# Altium footprint library Standard.PcbLib: 148 footprints (part 8 of 10)
Each footprint in its own frame and in the unit in brackets; x right, y up, seen from the top. Pads: shape width x height; smd on the part's side, far side on the other; paste and mask are expansions set on the pad; w line width, h text height; cw(c..) or ccw(c..) is an arc to the next point about the centre after c.
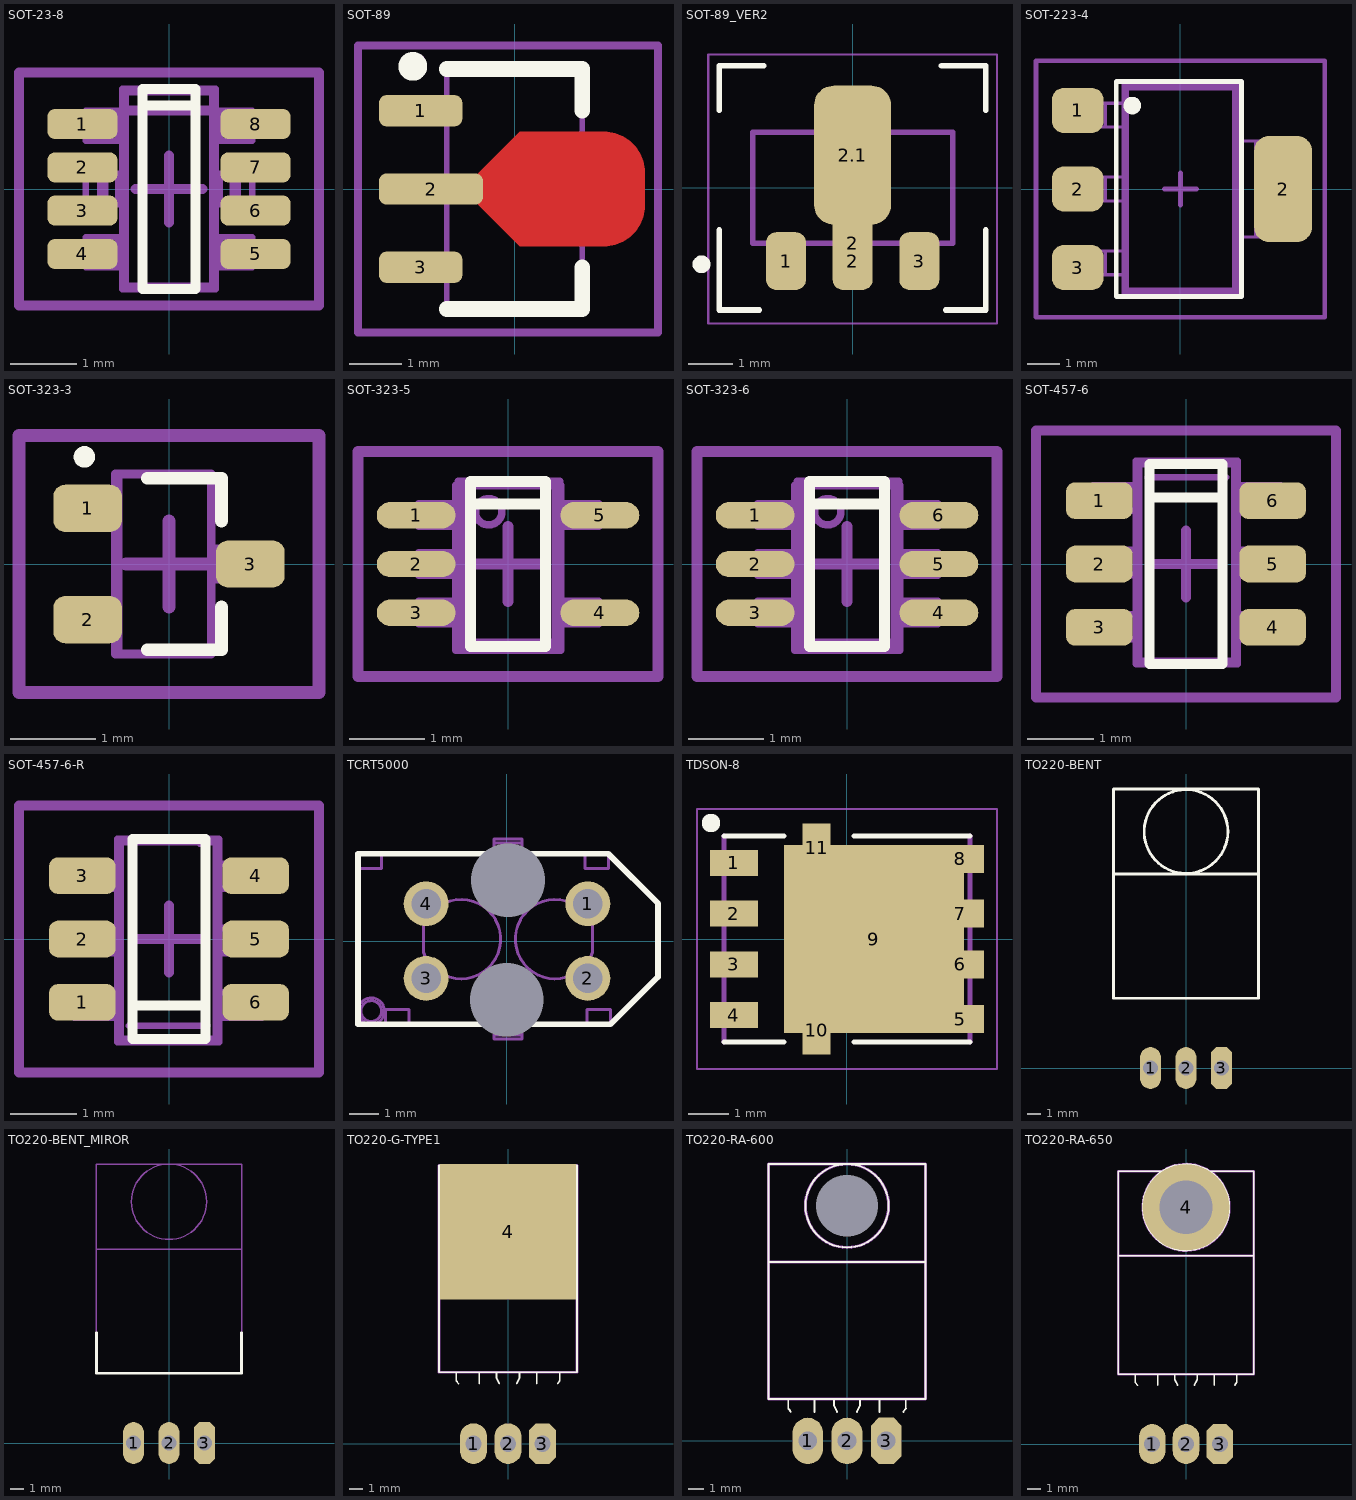
[diagram p7: the footprints below, top view; thin cyan lines are the x and y axes]

## SOT-23-8 [mm] "SOT23, 8-Leads, Body 2,90x2,30mm, Pitch 0,95mm, IPC Medium Density"
height 1.1
pads (8):
  rrect50% 1.05x0.45 smd: 1(-1.3,0.975) 2(-1.3,0.325) 3(-1.3,-0.325) 4(-1.3,-0.975) 5(1.3,-0.975) 6(1.3,-0.325) 7(1.3,0.325) 8(1.3,0.975)
Top Overlay:
  lines w0.15: -0.4,1.25 -0.4,-1.5 0.4,-1.5 0.4,1.25 ; -0.4,1.25 0.4,1.25 ; -0.4,1.25 -0.4,1.5 0.4,1.5 0.4,1.25
Top Assembly:
  lines w0.1: -1.25,-1.175 -0.7,-1.175 ; -1.25,-1.175 -1.25,-0.725 ; -1.25,-1.175 -1.25,-0.725 ; -1.25,-1.175 -1.027,-1.175 ; -1.25,-0.725 -0.7,-0.725 ; -1.25,-0.725 -1.027,-0.725 ; -1.25,-0.225 -1.25,0.225 ; -1.25,-0.225 -0.7,-0.225 ; -1.25,-0.225 -1.25,0.225 ; -1.25,-0.225 -1.027,-0.225 ; -1.25,0.225 -0.7,0.225 ; -1.25,0.225 -1.027,0.225 ; -1.25,0.725 -1.25,1.175 ; -1.25,0.725 -0.7,0.725 ; -1.25,0.725 -1.25,1.175 ; -1.25,0.725 -1.027,0.725 ; -1.25,1.175 -0.7,1.175 ; -1.25,1.175 -1.027,1.175 ; -1.027,-1.175 -0.977,-1.175 ; -1.027,-1.175 -1.027,-0.725 ; -1.027,-0.725 -0.977,-0.725 ; -1.027,-0.225 -0.977,-0.225 ; -1.027,-0.225 -1.027,0.225 ; -1.027,0.225 -0.977,0.225 ; -1.027,0.725 -0.977,0.725 ; -1.027,0.725 -1.027,1.175 ; -1.027,1.175 -0.977,1.175 ; -0.977,-1.175 -0.955,-1.175 ; -0.977,-1.175 -0.977,-0.725 ; -0.977,-0.725 -0.955,-0.725 ; -0.977,-0.225 -0.955,-0.225 ; -0.977,-0.225 -0.977,0.225 ; -0.977,0.225 -0.955,0.225 ; -0.977,0.725 -0.955,0.725 ; -0.977,0.725 -0.977,1.175 ; -0.977,1.175 -0.955,1.175 ; -0.955,-1.175 -0.757,-1.175 ; -0.955,-1.175 -0.955,-0.725 ; -0.955,-0.725 -0.757,-0.725 ; -0.955,-0.225 -0.757,-0.225 ; -0.955,-0.225 -0.955,0.225 ; -0.955,0.225 -0.757,0.225 ; -0.955,0.725 -0.757,0.725 ; -0.955,0.725 -0.955,1.175 ; -0.955,1.175 -0.757,1.175 ; -0.757,-1.175 -0.7,-1.175 ; -0.757,-1.175 -0.757,-0.725 ; -0.757,-0.725 -0.7,-0.725 ; -0.757,-0.225 -0.7,-0.225 ; -0.757,-0.225 -0.757,0.225 ; -0.757,0.225 -0.7,0.225 ; -0.757,0.725 -0.7,0.725 ; -0.757,0.725 -0.757,1.175 ; -0.757,1.175 -0.7,1.175 ; -0.7,-1.5 0.7,-1.5 ; -0.7,-1.5 -0.7,-1.175 ; -0.7,-1.5 -0.652,-1.452 ; -0.7,-1.5 -0.7,-1.175 ; -0.7,-1.5 0.7,-1.5 ; -0.7,-1.175 -0.7,-0.725 ; -0.7,-0.725 -0.7,-0.225 ; -0.7,-0.725 -0.7,-0.225 ; -0.7,-0.225 -0.7,0.225 ; -0.7,0.225 -0.7,0.725 ; -0.7,0.225 -0.7,0.725 ; -0.7,0.725 -0.7,1.175 ; -0.7,1.175 -0.7,1.5 ; -0.7,1.175 -0.7,1.5 ; -0.7,1.5 0.7,1.5 ; -0.7,1.5 -0.652,1.452 ; -0.7,1.5 0.7,1.5 ; -0.652,-1.452 -0.652,1.452 ; -0.652,-1.452 0.652,-1.452 ; -0.652,1.452 0.652,1.452 ; 0.652,-1.452 0.7,-1.5 ; 0.652,-1.452 0.652,1.452 ; 0.652,1.452 0.7,1.5 ; 0.7,-1.5 0.7,-1.175 ; 0.7,-1.5 0.7,-1.175 ; 0.7,-1.175 1.25,-1.175 ; 0.7,-1.175 0.7,-0.725 ; 0.7,-1.175 0.757,-1.175 ; 0.7,-0.725 0.7,0.725 ; 0.7,-0.725 1.25,-0.725 ; 0.7,-0.725 0.7,0.725 ; 0.7,-0.725 0.757,-0.725 ; 0.7,-0.225 0.757,-0.225 ; 0.7,-0.225 0.7,0.225 ; 0.7,-0.225 1.25,-0.225 ; 0.7,0.225 0.757,0.225 ; 0.7,0.225 1.25,0.225 ; 0.7,0.725 1.25,0.725 ; 0.7,0.725 0.7,1.175 ; 0.7,0.725 0.757,0.725 ; 0.7,1.175 0.7,1.5 ; 0.7,1.175 1.25,1.175 ; 0.7,1.175 0.7,1.5 ; 0.7,1.175 0.757,1.175 ; 0.757,-1.175 0.955,-1.175 ; 0.757,-1.175 0.757,-0.725 ; 0.757,-0.725 0.955,-0.725 ; 0.757,-0.225 0.757,0.225 ; 0.757,-0.225 0.955,-0.225 ; 0.757,0.225 0.955,0.225 ; 0.757,0.725 0.955,0.725 ; 0.757,0.725 0.757,1.175 ; 0.757,1.175 0.955,1.175 ; 0.955,-1.175 0.977,-1.175 ; 0.955,-1.175 0.955,-0.725 ; 0.955,-0.725 0.977,-0.725 ; 0.955,-0.225 0.955,0.225 ; 0.955,-0.225 0.977,-0.225 ; 0.955,0.225 0.977,0.225 ; 0.955,0.725 0.977,0.725 ; 0.955,0.725 0.955,1.175 ; 0.955,1.175 0.977,1.175 ; 0.977,-1.175 1.027,-1.175 ; 0.977,-1.175 0.977,-0.725 ; 0.977,-0.725 1.027,-0.725 ; 0.977,-0.225 0.977,0.225 ; 0.977,-0.225 1.027,-0.225 ; 0.977,0.225 1.027,0.225 ; 0.977,0.725 1.027,0.725 ; 0.977,0.725 0.977,1.175 ; 0.977,1.175 1.027,1.175 ; 1.027,-1.175 1.25,-1.175 ; 1.027,-1.175 1.027,-0.725 ; 1.027,-0.725 1.25,-0.725 ; 1.027,-0.225 1.027,0.225 ; 1.027,-0.225 1.25,-0.225 ; 1.027,0.225 1.25,0.225 ; 1.027,0.725 1.25,0.725 ; 1.027,0.725 1.027,1.175 ; 1.027,1.175 1.25,1.175 ; 1.25,-1.175 1.25,-0.725 ; 1.25,-1.175 1.25,-0.725 ; 1.25,-0.225 1.25,0.225 ; 1.25,-0.225 1.25,0.225 ; 1.25,0.725 1.25,1.175 ; 1.25,0.725 1.25,1.175
  lines w0.15: -0.7,1.175 0.7,1.175
Top Component Outline:
  lines w0.15: -0.5,0 0.5,0 ; 0,-0.5 0,0.5 ; -2.25,-1.75 2.25,-1.75 2.25,1.75 -2.25,1.75 -2.25,-1.75
3D body "SOT23-8.stp": height 1.2, standoff 0.02, extent -1.418,-1.5 1.418,1.5

## SOT-89 [mm] "SOT89, 3-Leads, Body 4,50x2,50mm, Pitch 1,50mm, Lead Span 4,1mm, IPC Medium Density"
height 1.6
pads (3):
  rrect50% 1.6x0.6 smd: 1(-1.8,1.5) 3(-1.8,-1.5)
  rrect50% 2x0.6 smd: 2(-1.6,0)
Top Layer:
  region: -0.7,0.3 0.1,1.1 1.7,1.1 1.779,1.1 1.933,1.069 2.079,1.009 2.21,0.921 2.321,0.81 2.409,0.679 2.469,0.533 2.5,0.379 2.5,0.3 2.5,-0.3 2.5,-0.379 2.469,-0.533 2.409,-0.679 2.321,-0.81 2.21,-0.921 2.079,-1.009 1.933,-1.069 1.779,-1.1 1.7,-1.1 0.1,-1.1 -0.7,-0.3
Top Overlay:
  circle w0.3: c-1.95,2.35 r0.125
  lines w0.3: -1.3,-2.3 1.3,-2.3 1.3,-1.5 ; -1.3,2.3 1.3,2.3 1.3,1.5
Top Assembly:
  circle w0.1: c-1.9,2.4 r0.158
  region: -1.328,-1.651 -1.328,-1.326 -2.228,-1.326 -2.228,-1.651
  region: -1.328,-0.163 -1.328,0.163 -2.228,0.163 -2.228,-0.163
  region: -1.328,1.397 -1.328,1.722 -2.228,1.722 -2.228,1.397
  region: 1.3,0.6 1.6,0.6 2,0.2 2,-0.2 1.6,-0.6 1.3,-0.6
  lines w0.1: -1.3,-2.3 -1.3,2.3 1.3,2.3 1.3,-2.3 -1.3,-2.3
  lines w0.254: 1.4,-0.6 1.6,-0.6 2,-0.2 2,0.2 1.6,0.6 1.4,0.6
Top Component Outline:
  lines w0.15: -0.5,0 0.5,0 ; 0,-0.5 0,0.5 ; -3,-2.75 -3,2.75 2.75,2.75 2.75,-2.75 -3,-2.75
3D body "SOT89.STEP": height 1.55, standoff 0.05, extent -2.149,-2.239 1.946,2.261

## SOT-89_VER2 [mm]
pads (5):
  rrect50% 0.9x1.3 smd: 1(-1.5,-1.65) 2(0,-1.65) 2(0,-1.25) 3(1.5,-1.65)
  rrect50% 1.733x3.125 smd: 2.1(0,0.737)
Top Overlay:
  circle w0.2: c-3.405,-1.722 r0.1
  lines w0.127: -3,-0.95 -3,-2.75 -2.1,-2.75 ; -3,1.75 -3,2.75 -2,2.75 ; 2,2.75 3,2.75 3,1.75 ; 2.1,-2.75 3,-2.75 3,-0.95
Top Assembly:
  lines w0.127: -2.25,-1.25 -2.25,1.25 2.25,1.25 2.25,-1.25 -2.25,-1.25
Top Component Outline:
  lines w0.05: -3.25,-3.054 -3.25,3 3.25,3 3.25,-3.054 -3.25,-3.054
3D body "SOT89.STEP": height 1.55, standoff 0.05, extent -2.25,-2.082 2.25,2.013

## SOT-223-4 [mm] "SOT223, 4-Leads, Body 6,50x7,00mm (avg), Pitch 2,30mm, IPC Medium Density"
height 1.8
pads (4):
  rrect50% 1.6x1.4 smd: 1(-3.2,2.45) 2(-3.2,0) 3(-3.2,-2.45)
  rrect50% 1.8x3.3 smd: 2(3.2,0)
Top Overlay:
  circle w0.3: c-1.5,2.6 r0.125
  lines w0.15: -2,-3.35 1.9,-3.35 1.9,3.35 -2,3.35 -2,-3.35
Top Assembly:
  drawing of 520 lines, arcs and shapes, not listed
Top Component Outline:
  lines w0.15: -0.5,0 0.5,0 ; 0,-0.5 0,0.5 ; -4.5,-4 4.5,-4 4.5,4 -4.5,4 -4.5,-4
3D body "SOT223.STEP": height 1.64, standoff -0.01, extent -3.5,-3.25 3.5,3.25

## SOT-323-3 [mm] "SOT-323/SC-70; 3 Leads; Body 2.2 x 2.2 mm, inc. leads (LxW max)"
height 1
pads (3):
  rrect50% 0.8x0.55 smd: 1(-0.95,0.65) 2(-0.95,-0.65) 3(0.95,0)
Top Overlay:
  circle w0.15: c-0.987,1.25 r0.05
  lines w0.15: -0.25,-1 0.613,-1 0.613,-0.5 ; -0.25,1 0.613,1 0.613,0.5
Top Assembly:
  lines w0.1: -0.625,-0.825 -0.625,-1.05 -0.592,-1.05 ; -0.625,-0.475 -0.625,0.475 ; -0.625,0.825 -0.625,1.05 -0.592,1.05 ; -0.771,-0.825 -0.771,-0.475 ; -0.771,-0.825 -1.101,-0.825 -1.101,-0.475 -0.771,-0.475 ; -0.771,-0.825 -0.756,-0.825 ; -0.771,-0.475 -0.756,-0.475 ; -0.771,0.475 -0.771,0.825 ; -0.771,0.475 -1.101,0.475 -1.101,0.825 -0.771,0.825 ; -0.771,0.475 -0.756,0.475 ; -0.771,0.825 -0.756,0.825 ; -0.756,-0.825 -0.724,-0.825 ; -0.756,-0.825 -0.756,-0.475 ; -0.756,-0.475 -0.724,-0.475 ; -0.756,0.475 -0.724,0.475 ; -0.756,0.475 -0.756,0.825 ; -0.756,0.825 -0.724,0.825 ; -0.724,-0.825 -0.724,-0.475 ; -0.724,-0.825 -0.623,-0.825 -0.623,-0.475 -0.724,-0.475 ; -0.724,0.475 -0.724,0.825 ; -0.724,0.475 -0.623,0.475 -0.623,0.825 -0.724,0.825 ; -0.592,-1.05 0.492,-1.05 0.492,1.05 -0.592,1.05 ; -0.592,-1.05 -0.592,1.05 ; 0.592,-0.175 0.492,-0.175 0.492,0.175 0.592,0.175 ; 0.592,-0.175 0.624,-0.175 ; 0.592,-0.175 0.592,0.175 ; 0.592,0.175 0.624,0.175 ; 0.624,-0.175 0.624,0.175 ; 0.624,-0.175 0.639,-0.175 ; 0.624,0.175 0.639,0.175 ; 0.639,-0.175 0.97,-0.175 0.97,0.175 0.639,0.175 ; 0.639,-0.175 0.639,0.175
Top Component Outline:
  lines w0.15: -0.5,0 0.5,0 ; 0,-0.5 0,0.5 ; -1.75,-1.5 1.75,-1.5 1.75,1.5 -1.75,1.5 -1.75,-1.5
3D body "SOT323.STEP": height 0.9, standoff 0, extent -1.037,-1.05 1.063,1.05

## SOT-323-5 [mm] "SOTFL, 5-Leads, Body 2,00x2,10mm, Pitch 0,65mm, IPC Medium Density"
height 1.1
pads (5):
  oval 1.05x0.35 smd: 1(-1.225,0.65) 2(-1.225,0) 3(-1.225,-0.65) 4(1.225,-0.65) 5(1.225,0.65)
Top Overlay:
  lines w0.15: -0.5,0.8 0.5,0.8 ; -0.5,-1.1 -0.5,1.1 0.5,1.1 0.5,-1.1 -0.5,-1.1
Top Assembly:
  circle w0.1: c-0.258,0.696 r0.175
  lines w0.1: 0.687,-0.149 0.687,-0.499 ; 0.687,0.151 0.687,0.501 ; -1.016,-0.799 -1.016,-0.499 ; -1.016,-0.799 -1.188,-0.799 -1.188,-0.499 -1.016,-0.499 ; -1.016,-0.799 -0.925,-0.799 ; -1.016,-0.499 -0.925,-0.499 ; -1.016,-0.149 -1.016,0.151 ; -1.016,-0.149 -1.188,-0.149 -1.188,0.151 -1.016,0.151 ; -1.016,-0.149 -0.925,-0.149 ; -1.016,0.151 -0.925,0.151 ; -1.016,0.501 -1.016,0.801 ; -1.016,0.501 -1.188,0.501 -1.188,0.801 -1.016,0.801 ; -1.016,0.501 -0.925,0.501 ; -1.016,0.801 -0.925,0.801 ; -0.925,-0.799 -0.925,-0.499 ; -0.925,-0.799 -0.913,-0.799 ; -0.925,-0.499 -0.913,-0.499 ; -0.925,-0.149 -0.925,0.151 ; -0.925,-0.149 -0.913,-0.149 ; -0.925,0.151 -0.913,0.151 ; -0.925,0.501 -0.925,0.801 ; -0.925,0.501 -0.913,0.501 ; -0.925,0.801 -0.913,0.801 ; -0.913,-0.799 -0.913,-0.499 ; -0.913,-0.799 -0.663,-0.799 ; -0.913,-0.499 -0.663,-0.499 ; -0.913,-0.149 -0.913,0.151 ; -0.913,-0.149 -0.663,-0.149 ; -0.913,0.151 -0.663,0.151 ; -0.913,0.501 -0.913,0.801 ; -0.913,0.501 -0.663,0.501 ; -0.913,0.801 -0.663,0.801 ; -0.663,-1.099 0.687,-1.099 ; -0.663,-1.099 -0.663,-0.799 ; -0.663,-1.099 -0.607,-1.042 ; -0.663,-0.799 -0.663,-0.499 ; -0.663,-0.799 -0.642,-0.799 -0.642,-0.499 -0.663,-0.499 ; -0.663,-0.499 -0.663,-0.149 ; -0.663,-0.149 -0.663,0.151 ; -0.663,-0.149 -0.642,-0.149 -0.642,0.151 -0.663,0.151 ; -0.663,0.151 -0.663,0.501 ; -0.663,0.501 -0.663,0.801 ; -0.663,0.501 -0.642,0.501 -0.642,0.801 -0.663,0.801 ; -0.663,0.801 -0.663,1.101 ; -0.663,1.101 0.687,1.101 ; -0.663,1.101 -0.607,1.045 ; -0.607,-1.042 0.631,-1.042 ; -0.607,-1.042 -0.607,1.045 ; -0.607,1.045 0.631,1.045 ; 0.631,-1.042 0.687,-1.099 ; 0.631,-1.042 0.631,1.045 ; 0.631,1.045 0.687,1.101 ; 0.687,-1.099 0.687,-0.799 ; 0.687,-0.799 0.687,-0.499 ; 0.687,-0.799 0.666,-0.799 0.666,-0.499 0.687,-0.499 ; 0.687,-0.799 0.937,-0.799 ; 0.687,-0.499 0.937,-0.499 ; 0.687,0.501 0.687,0.801 ; 0.687,0.501 0.666,0.501 0.666,0.801 0.687,0.801 ; 0.687,0.501 0.937,0.501 ; 0.687,0.801 0.937,0.801 ; 0.687,0.801 0.687,1.101 ; 0.937,-0.799 0.937,-0.499 ; 0.937,-0.799 0.949,-0.799 ; 0.937,-0.499 0.949,-0.499 ; 0.937,0.501 0.937,0.801 ; 0.937,0.501 0.949,0.501 ; 0.937,0.801 0.949,0.801 ; 0.949,-0.799 0.949,-0.499 ; 0.949,-0.799 1.04,-0.799 ; 0.949,-0.499 1.04,-0.499 ; 0.949,0.501 0.949,0.801 ; 0.949,0.501 1.04,0.501 ; 0.949,0.801 1.04,0.801 ; 1.04,-0.799 1.04,-0.499 ; 1.04,-0.799 1.212,-0.799 1.212,-0.499 1.04,-0.499 ; 1.04,0.501 1.04,0.801 ; 1.04,0.501 1.212,0.501 1.212,0.801 1.04,0.801 ; -0.7,-1.15 -0.7,1.05 0.7,1.05 0.7,-1.15 -0.7,-1.15
Top Component Outline:
  lines w0.15: -0.5,0 0.5,0 ; 0,-0.5 0,0.5 ; -2,-1.5 -2,1.5 2,1.5 2,-1.5 -2,-1.5
3D body "User Library-SOT353-1.step": height 1.1, standoff 0, extent -1.2,-1.1 1.2,1.1

## SOT-323-6 [mm] "SOTFL, 6-Leads, Body 2,00x2,10mm, Pitch 0,65mm, IPC Medium Density"
height 1.1
pads (6):
  oval 1.05x0.35 smd: 1(-1.225,0.65) 2(-1.225,0) 3(-1.225,-0.65) 4(1.225,-0.65) 5(1.225,0) 6(1.225,0.65)
Top Overlay:
  lines w0.15: -0.5,0.8 0.5,0.8 ; -0.5,-1.1 -0.5,1.1 0.5,1.1 0.5,-1.1 -0.5,-1.1
Top Assembly:
  circle w0.1: c-0.258,0.696 r0.175
  lines w0.1: -1.016,-0.799 -1.016,-0.499 ; -1.016,-0.799 -1.188,-0.799 -1.188,-0.499 -1.016,-0.499 ; -1.016,-0.799 -0.925,-0.799 ; -1.016,-0.499 -0.925,-0.499 ; -1.016,-0.149 -1.016,0.151 ; -1.016,-0.149 -1.188,-0.149 -1.188,0.151 -1.016,0.151 ; -1.016,-0.149 -0.925,-0.149 ; -1.016,0.151 -0.925,0.151 ; -1.016,0.501 -1.016,0.801 ; -1.016,0.501 -1.188,0.501 -1.188,0.801 -1.016,0.801 ; -1.016,0.501 -0.925,0.501 ; -1.016,0.801 -0.925,0.801 ; -0.925,-0.799 -0.925,-0.499 ; -0.925,-0.799 -0.913,-0.799 ; -0.925,-0.499 -0.913,-0.499 ; -0.925,-0.149 -0.925,0.151 ; -0.925,-0.149 -0.913,-0.149 ; -0.925,0.151 -0.913,0.151 ; -0.925,0.501 -0.925,0.801 ; -0.925,0.501 -0.913,0.501 ; -0.925,0.801 -0.913,0.801 ; -0.913,-0.799 -0.913,-0.499 ; -0.913,-0.799 -0.663,-0.799 ; -0.913,-0.499 -0.663,-0.499 ; -0.913,-0.149 -0.913,0.151 ; -0.913,-0.149 -0.663,-0.149 ; -0.913,0.151 -0.663,0.151 ; -0.913,0.501 -0.913,0.801 ; -0.913,0.501 -0.663,0.501 ; -0.913,0.801 -0.663,0.801 ; -0.663,-1.099 0.687,-1.099 ; -0.663,-1.099 -0.663,-0.799 ; -0.663,-1.099 -0.607,-1.042 ; -0.663,-0.799 -0.663,-0.499 ; -0.663,-0.799 -0.642,-0.799 -0.642,-0.499 -0.663,-0.499 ; -0.663,-0.499 -0.663,-0.149 ; -0.663,-0.149 -0.663,0.151 ; -0.663,-0.149 -0.642,-0.149 -0.642,0.151 -0.663,0.151 ; -0.663,0.151 -0.663,0.501 ; -0.663,0.501 -0.663,0.801 ; -0.663,0.501 -0.642,0.501 -0.642,0.801 -0.663,0.801 ; -0.663,0.801 -0.663,1.101 ; -0.663,1.101 0.687,1.101 ; -0.663,1.101 -0.607,1.045 ; -0.607,-1.042 0.631,-1.042 ; -0.607,-1.042 -0.607,1.045 ; -0.607,1.045 0.631,1.045 ; 0.631,-1.042 0.687,-1.099 ; 0.631,-1.042 0.631,1.045 ; 0.631,1.045 0.687,1.101 ; 0.687,-1.099 0.687,-0.799 ; 0.687,-0.799 0.687,-0.499 ; 0.687,-0.799 0.666,-0.799 0.666,-0.499 0.687,-0.499 ; 0.687,-0.799 0.937,-0.799 ; 0.687,-0.499 0.937,-0.499 ; 0.687,-0.499 0.687,-0.149 ; 0.687,-0.149 0.687,0.151 ; 0.687,-0.149 0.666,-0.149 0.666,0.151 0.687,0.151 ; 0.687,-0.149 0.937,-0.149 ; 0.687,0.151 0.937,0.151 ; 0.687,0.151 0.687,0.501 ; 0.687,0.501 0.687,0.801 ; 0.687,0.501 0.666,0.501 0.666,0.801 0.687,0.801 ; 0.687,0.501 0.937,0.501 ; 0.687,0.801 0.937,0.801 ; 0.687,0.801 0.687,1.101 ; 0.937,-0.799 0.937,-0.499 ; 0.937,-0.799 0.949,-0.799 ; 0.937,-0.499 0.949,-0.499 ; 0.937,-0.149 0.937,0.151 ; 0.937,-0.149 0.949,-0.149 ; 0.937,0.151 0.949,0.151 ; 0.937,0.501 0.937,0.801 ; 0.937,0.501 0.949,0.501 ; 0.937,0.801 0.949,0.801 ; 0.949,-0.799 0.949,-0.499 ; 0.949,-0.799 1.04,-0.799 ; 0.949,-0.499 1.04,-0.499 ; 0.949,-0.149 0.949,0.151 ; 0.949,-0.149 1.04,-0.149 ; 0.949,0.151 1.04,0.151 ; 0.949,0.501 0.949,0.801 ; 0.949,0.501 1.04,0.501 ; 0.949,0.801 1.04,0.801 ; 1.04,-0.799 1.04,-0.499 ; 1.04,-0.799 1.212,-0.799 1.212,-0.499 1.04,-0.499 ; 1.04,-0.149 1.04,0.151 ; 1.04,-0.149 1.212,-0.149 1.212,0.151 1.04,0.151 ; 1.04,0.501 1.04,0.801 ; 1.04,0.501 1.212,0.501 1.212,0.801 1.04,0.801 ; -0.7,-1.15 -0.7,1.05 0.7,1.05 0.7,-1.15 -0.7,-1.15
Top Component Outline:
  lines w0.15: -0.5,0 0.5,0 ; 0,-0.5 0,0.5 ; -2,-1.5 -2,1.5 2,1.5 2,-1.5 -2,-1.5
3D body "TSOP65P260X110-6N.step": height 1.1, standoff 0, extent -1.3,-1.1 1.3,1.1

## SOT-457-6 [mm] "SOP, 6-Leads, Body 3,18x1,80mm, Pitch 0,95mm, IPC Medium Density"
height 2.65
pads (6):
  rrect50% 1x0.55 smd: 1(-1.3,0.95) 2(-1.3,0) 3(-1.3,-0.95) 4(1.3,-0.95) 5(1.3,0) 6(1.3,0.95)
Top Overlay:
  lines w0.15: -0.55,1 0.55,1 ; -0.55,-1.5 0.55,-1.5 0.55,1.5 -0.55,1.5 -0.55,-1.5
Top Assembly:
  lines w0.1: -0.75,-1.129 -0.877,-1.129 ; -0.75,-0.753 -0.877,-0.753 ; -0.75,-0.164 -0.877,-0.164 ; -0.75,0.212 -0.877,0.212 ; -0.75,0.801 -0.877,0.801 ; -0.75,1.177 -0.877,1.177 ; -0.572,1.3 0.603,1.3 ; 0.774,-1.129 0.911,-1.129 ; 0.774,-0.753 0.911,-0.753 ; 0.774,-0.164 0.911,-0.164 ; 0.774,0.212 0.911,0.212 ; 0.774,0.801 0.911,0.801 ; 0.774,1.177 0.911,1.177 ; -1.079,-1.129 -1.07,-1.129 ; -1.079,-1.129 -1.395,-1.129 -1.395,-0.753 -1.079,-0.753 ; -1.079,-1.129 -1.079,-0.753 ; -1.079,-0.753 -1.07,-0.753 ; -1.079,-0.164 -1.07,-0.164 ; -1.079,-0.164 -1.395,-0.164 -1.395,0.212 -1.079,0.212 ; -1.079,-0.164 -1.079,0.212 ; -1.079,0.212 -1.07,0.212 ; -1.079,0.801 -1.07,0.801 ; -1.079,0.801 -1.395,0.801 -1.395,1.177 -1.079,1.177 ; -1.079,0.801 -1.079,1.177 ; -1.079,1.177 -1.07,1.177 ; -1.07,-1.129 -1.07,-0.753 ; -1.07,-1.129 -0.877,-1.129 ; -1.07,-0.753 -0.877,-0.753 ; -1.07,-0.164 -1.07,0.212 ; -1.07,-0.164 -0.877,-0.164 ; -1.07,0.212 -0.877,0.212 ; -1.07,0.801 -1.07,1.177 ; -1.07,0.801 -0.877,0.801 ; -1.07,1.177 -0.877,1.177 ; -0.877,-1.129 -0.877,-0.753 ; -0.877,-0.164 -0.877,0.212 ; -0.877,0.801 -0.877,1.177 ; -0.75,-1.5 0.774,-1.5 ; -0.75,-1.5 -0.699,-1.449 ; -0.75,-1.5 -0.75,1.548 ; -0.75,1.548 -0.699,1.497 ; -0.75,1.548 0.774,1.548 ; -0.699,-1.449 0.723,-1.449 ; -0.699,-1.449 -0.699,1.497 ; -0.699,1.497 0.723,1.497 ; 0.723,-1.449 0.723,1.497 ; 0.723,-1.449 0.774,-1.5 ; 0.723,1.497 0.774,1.548 ; 0.774,-1.5 0.774,1.548 ; 0.911,-1.129 1.101,-1.129 ; 0.911,-1.129 0.911,-0.753 ; 0.911,-0.753 1.101,-0.753 ; 0.911,-0.164 1.101,-0.164 ; 0.911,-0.164 0.911,0.212 ; 0.911,0.212 1.101,0.212 ; 0.911,0.801 1.101,0.801 ; 0.911,0.801 0.911,1.177 ; 0.911,1.177 1.101,1.177 ; 1.101,-1.129 1.101,-0.753 ; 1.101,-1.129 1.105,-1.129 ; 1.101,-0.753 1.105,-0.753 ; 1.101,-0.164 1.101,0.212 ; 1.101,-0.164 1.105,-0.164 ; 1.101,0.212 1.105,0.212 ; 1.101,0.801 1.101,1.177 ; 1.101,0.801 1.105,0.801 ; 1.101,1.177 1.105,1.177 ; 1.105,-1.129 1.42,-1.129 1.42,-0.753 1.105,-0.753 ; 1.105,-1.129 1.105,-0.753 ; 1.105,-0.164 1.42,-0.164 1.42,0.212 1.105,0.212 ; 1.105,-0.164 1.105,0.212 ; 1.105,0.801 1.42,0.801 1.42,1.177 1.105,1.177 ; 1.105,0.801 1.105,1.177
Top Component Outline:
  lines w0.15: -0.5,0 0.5,0 ; 0,-0.5 0,0.5 ; -2.25,-2 2.25,-2 2.25,2 -2.25,2 -2.25,-2
3D body "User Library-SOT457.STEP": height 1, standoff 0, extent -1.4,-1.5 1.4,1.5

## SOT-457-6-R [mm] "SOP, 6-Leads, Body 3,18x1,80mm, Pitch 0,95mm, IPC Medium Density"
height 2.65
pads (6):
  rrect50% 1x0.55 smd: 1(-1.3,-0.95) 2(-1.3,0) 3(-1.3,0.95) 4(1.3,0.95) 5(1.3,0) 6(1.3,-0.95)
Top Overlay:
  lines w0.15: -0.55,-1 0.55,-1 ; -0.55,-1.5 -0.55,1.5 0.55,1.5 0.55,-1.5 -0.55,-1.5
Top Assembly:
  lines w0.1: -0.774,-1.177 -0.911,-1.177 ; -0.774,-0.801 -0.911,-0.801 ; -0.774,-0.212 -0.911,-0.212 ; -0.774,0.164 -0.911,0.164 ; -0.774,0.753 -0.911,0.753 ; -0.774,1.129 -0.911,1.129 ; -0.603,-1.3 0.572,-1.3 ; 0.46,1.429 0.46,1.497 ; 0.75,-1.177 0.877,-1.177 ; 0.75,-0.801 0.877,-0.801 ; 0.75,-0.212 0.877,-0.212 ; 0.75,0.164 0.877,0.164 ; 0.75,0.753 0.877,0.753 ; 0.75,1.129 0.877,1.129 ; -1.105,-1.177 -1.101,-1.177 ; -1.105,-1.177 -1.42,-1.177 -1.42,-0.801 -1.105,-0.801 ; -1.105,-1.177 -1.105,-0.801 ; -1.105,-0.801 -1.101,-0.801 ; -1.105,-0.212 -1.101,-0.212 ; -1.105,-0.212 -1.42,-0.212 -1.42,0.164 -1.105,0.164 ; -1.105,-0.212 -1.105,0.164 ; -1.105,0.164 -1.101,0.164 ; -1.105,0.753 -1.101,0.753 ; -1.105,0.753 -1.42,0.753 -1.42,1.129 -1.105,1.129 ; -1.105,0.753 -1.105,1.129 ; -1.105,1.129 -1.101,1.129 ; -1.101,-1.177 -1.101,-0.801 ; -1.101,-1.177 -0.911,-1.177 ; -1.101,-0.801 -0.911,-0.801 ; -1.101,-0.212 -1.101,0.164 ; -1.101,-0.212 -0.911,-0.212 ; -1.101,0.164 -0.911,0.164 ; -1.101,0.753 -1.101,1.129 ; -1.101,0.753 -0.911,0.753 ; -1.101,1.129 -0.911,1.129 ; -0.911,-1.177 -0.911,-0.801 ; -0.911,-0.212 -0.911,0.164 ; -0.911,0.753 -0.911,1.129 ; -0.774,-1.548 -0.723,-1.497 ; -0.774,-1.548 -0.774,1.5 ; -0.774,-1.548 0.75,-1.548 ; -0.774,1.5 -0.723,1.449 ; -0.774,1.5 0.75,1.5 ; -0.723,-1.497 0.699,-1.497 ; -0.723,-1.497 -0.723,1.449 ; -0.723,1.449 0.699,1.449 ; 0.699,-1.497 0.699,1.449 ; 0.699,-1.497 0.75,-1.548 ; 0.699,1.449 0.75,1.5 ; 0.75,-1.548 0.75,1.5 ; 0.877,-1.177 1.07,-1.177 ; 0.877,-1.177 0.877,-0.801 ; 0.877,-0.801 1.07,-0.801 ; 0.877,-0.212 1.07,-0.212 ; 0.877,-0.212 0.877,0.164 ; 0.877,0.164 1.07,0.164 ; 0.877,0.753 1.07,0.753 ; 0.877,0.753 0.877,1.129 ; 0.877,1.129 1.07,1.129 ; 1.07,-1.177 1.07,-0.801 ; 1.07,-1.177 1.079,-1.177 ; 1.07,-0.801 1.079,-0.801 ; 1.07,-0.212 1.07,0.164 ; 1.07,-0.212 1.079,-0.212 ; 1.07,0.164 1.079,0.164 ; 1.07,0.753 1.07,1.129 ; 1.07,0.753 1.079,0.753 ; 1.07,1.129 1.079,1.129 ; 1.079,-1.177 1.395,-1.177 1.395,-0.801 1.079,-0.801 ; 1.079,-1.177 1.079,-0.801 ; 1.079,-0.212 1.395,-0.212 1.395,0.164 1.079,0.164 ; 1.079,-0.212 1.079,0.164 ; 1.079,0.753 1.395,0.753 1.395,1.129 1.079,1.129 ; 1.079,0.753 1.079,1.129
Top Component Outline:
  lines w0.15: -0.5,0 0.5,0 ; 0,-0.5 0,0.5 ; -2.25,-2 -2.25,2 2.25,2 2.25,-2 -2.25,-2
3D body "User Library-SOT457.STEP": height 1, standoff 0, extent -1.4,-1.5 1.4,1.5

## TCRT5000 [mm]
height 18
pads (6):
  round 0 hole 2.5: 0(0,-2) 0(0.035,2.07)
  round 1.524 hole 1: 1(2.75,1.27) 2(2.75,-1.27) 3(-2.75,-1.27) 4(-2.75,1.27)
Top Overlay:
  lines w0.2: -5.065,-2.83 -5.065,2.97 3.448,2.97 5.135,1.283 5.135,-1.217 3.522,-2.83 -5.065,-2.83
Top Assembly:
  circle w0.1: c-4.615,-2.38 r0.45
  circle w0.1: c-4.615,-2.38 r0.35
  lines w0.1: -0.44,-2.83 -0.69,-2.83 ; -0.44,2.97 -0.69,2.97 ; 0.51,-2.83 0.76,-2.83 ; 0.51,2.97 0.76,2.97 ; -5.065,2.47 -4.265,2.47 -4.265,2.97 ; -5.065,2.47 -5.065,2.97 -4.265,2.97 ; -5.065,2.47 -5.065,-2.38 -5.065,-2.83 -4.615,-2.83 -4.126,-2.83 ; -4.265,2.97 -0.69,2.97 ; -4.126,-2.83 -4.126,-2.33 -3.326,-2.33 -3.326,-2.83 ; -4.126,-2.83 -3.326,-2.83 ; -3.326,-2.83 -0.69,-2.83 ; -0.69,-2.83 -0.69,-1.33 -0.44,-1.33 -0.44,-1.63 ; -0.69,2.97 -0.69,1.47 -0.44,1.47 -0.44,1.77 ; -0.44,-3.194 -0.44,-2.434 ; -0.44,-3.194 -0.44,-3.33 0.51,-3.33 0.51,-3.194 ; -0.44,-3.194 0.51,-3.194 ; -0.44,-2.434 -0.44,-2.27 ; -0.44,-2.434 0.51,-2.434 ; -0.44,-2.27 -0.44,-1.93 ; -0.44,-2.27 0.51,-2.27 ; -0.44,-1.93 -0.44,-1.63 ; -0.44,-1.93 0.51,-1.93 ; -0.44,-1.63 0.51,-1.63 ; -0.44,1.77 0.51,1.77 ; -0.44,1.77 -0.44,2.07 ; -0.44,2.07 -0.44,2.41 ; -0.44,2.07 0.51,2.07 ; -0.44,2.41 -0.44,2.574 ; -0.44,2.41 0.51,2.41 ; -0.44,2.574 -0.44,3.334 ; -0.44,2.574 0.51,2.574 ; -0.44,3.334 -0.44,3.47 0.51,3.47 0.51,3.334 ; -0.44,3.334 0.51,3.334 ; 0.51,-3.194 0.51,-2.434 ; 0.51,-2.434 0.51,-2.27 ; 0.51,-2.27 0.51,-1.93 ; 0.51,-1.93 0.51,-1.63 ; 0.51,-1.63 0.51,-1.33 0.76,-1.33 0.76,-2.83 ; 0.51,1.77 0.51,2.07 ; 0.51,1.77 0.51,1.47 0.76,1.47 0.76,2.97 ; 0.51,2.07 0.51,2.41 ; 0.51,2.41 0.51,2.574 ; 0.51,2.574 0.51,3.334 ; 0.76,-2.83 2.722,-2.83 ; 0.76,2.97 2.648,2.97 ; 2.648,2.97 2.648,2.47 3.448,2.47 3.448,2.97 ; 2.648,2.97 3.448,2.97 ; 2.722,-2.83 2.722,-2.33 3.522,-2.33 3.522,-2.83 ; 2.722,-2.83 3.522,-2.83 ; 3.448,2.97 5.135,1.283 5.135,-1.217 3.522,-2.83 ; -2.838,-0.383 ccw(c-1.565,0.066) -2.568,-0.838 -2.439,-0.8 -2.309,-0.915 -2.309,-1.061 ccw(c-1.565,0.066) -2.294,1.203 -2.294,1.041 -2.439,0.932 -2.573,0.964 ccw(c-1.565,0.066) -2.838,0.515 -2.838,-0.383 ; 2.364,1.041 2.509,0.932 2.643,0.964 cw(c1.635,0.066) 2.908,0.515 2.908,-0.383 cw(c1.635,0.066) 2.638,-0.838 2.509,-0.8 2.379,-0.915 2.379,-1.061 cw(c1.635,0.066) 2.364,1.203 2.364,1.041
3D body "User Library-corpo TCRT 5000.step": height 9.05, standoff -1.45, extent -5.065,-3.4 5.135,3.4

## TDSON-8 [mm]
height 1
pads (11):
  rect 1.2x0.65 smd: 1(-2.825,1.905) 2(-2.825,0.635) 3(-2.825,-0.635) 4(-2.825,-1.905)
  rect 1.2x0.7 smd: 5(2.825,-2) 6(2.825,-0.635) 7(2.825,0.635) 8(2.825,2)
  rect 4.5x4.7 smd: 9(0.675,0)
  rect 0.7x1.2 smd: 10(-0.762,-2.286) 11(-0.762,2.286)
Top Overlay:
  circle w0.4: c-3.4,2.9 r0.03
  lines w0.127: -3.075,-2.575 -1.575,-2.575 ; -3.075,2.575 -1.575,2.575 ; 0.175,-2.575 3.075,-2.575 ; 0.175,2.575 3.075,2.575
Top Assembly:
  lines w0.127: -3.075,-2.575 -3.075,2.575 ; 3.075,-2.575 3.075,2.575
Top Component Outline:
  lines w0.05: -3.75,-3.25 -3.75,3.25 3.75,3.25 3.75,-3.25 -3.75,-3.25
3D body "User Library-TDSON-8-1.step": height 1.05, standoff 0.05, extent -3.048,-2.667 3.102,2.683

## TO220-BENT [mm]
pads (3):
  oval 1.5x3 hole 1.1: 1(-2.54,0) 2(0,0)
  oct 1.5x3 hole 1.1: 3(2.54,0)
Top Overlay:
  circle w0.2: c0,16.95 r3
  lines w0.2: -5.2,13.9 5.2,13.9 ; -5.2,5 -5.2,20 5.2,20 5.2,5 -5.2,5
Top Assembly:
  circle w0.1: c0,16.95 r3
  lines w0.1: -5.2,13.899 5.2,13.9 ; -5.2,5.009 -5.2,20 5.2,20 5.2,5.009 -5.2,5.009
3D body "TO-220_horizontal_line.stp": height 4.7, standoff -2.95, extent -5.25,-0.3 5.25,19.95

## TO220-BENT_MIROR [mm]
pads (3):
  oval 1.5x3 hole 1.1: 1(-2.54,0) 2(0,0)
  oct 1.5x3 hole 1.1: 3(2.54,0)
Top Overlay:
  lines w0.2: -5.2,7.9 -5.2,5 5.2,5 5.2,7.9
Top Assembly:
  circle w0.1: c0,17.3 r2.7
  lines w0.1: -5.2,13.899 5.2,13.9 ; -5.2,5.009 5.2,5.009 5.2,20 -5.2,20 -5.2,5.009
3D body "TO-220_horizontal_back_line.stp": height 3.8, standoff -6.2, extent -5.25,-0.3 5.25,19.95

## TO220-G-TYPE1 [mm]
pads (4):
  oval 2x3 hole 1.2: 1(-2.54,0) 2(0,0)
  oct 2x3 hole 1.2: 3(2.54,0)
  rect 10x10 smd: 4(0,15.6)
Top Overlay:
  circle w0.125: c0,17.78 r2.7
  lines w0.125: -5.08,14.139 5.08,14.139 ; -3.81,4.614 -3.81,5.249 ; -3.762,4.582 -3.647,4.421 ; -2.117,4.421 -2.117,5.249 ; -0.847,5.249 -0.847,4.826 -0.635,4.421 ; 0.635,4.421 0.847,4.826 0.847,5.249 ; 2.117,4.421 2.117,5.249 ; 3.655,4.421 3.818,4.638 ; 3.81,4.614 3.81,5.249 ; -5.08,5.249 5.08,5.249 5.08,20.489 -5.08,20.489 -5.08,5.249
Top Assembly:
  circle w0.2: c0,17.78 r2.7
  lines w0.2: -5.08,14.139 5.08,14.139 ; -5.08,5.249 5.08,5.249 5.08,20.489 -5.08,20.489 -5.08,5.249
3D body "TO220-RA-650.STEP": height 4.45, standoff -1.79, extent -5.08,-0.19 5.08,20.36

## TO220-RA-600 [mm]
pads (4):
  oval 2x3 hole 1.2: 1(-2.54,0) 2(0,0)
  round 0 hole 4 unplated: 2(0,15.24)
  oct 2x3 hole 1.2: 3(2.54,0)
Top Overlay:
  circle w0.125: c0,15.24 r2.7
  lines w0.125: -5.08,11.599 5.08,11.599 ; -3.81,2.074 -3.81,2.709 ; -3.762,2.042 -3.647,1.881 ; -2.117,1.881 -2.117,2.709 ; -0.847,2.709 -0.847,2.286 -0.635,1.881 ; 0.635,1.881 0.847,2.286 0.847,2.709 ; 2.117,1.881 2.117,2.709 ; 3.655,1.881 3.818,2.098 ; 3.81,2.074 3.81,2.709 ; -5.08,2.709 5.08,2.709 5.08,17.949 -5.08,17.949 -5.08,2.709
Top Assembly:
  circle w0.2: c0,15.24 r2.7
  lines w0.2: -5.08,11.599 5.08,11.599 ; -5.08,2.709 5.08,2.709 5.08,17.949 -5.08,17.949 -5.08,2.709
3D body "TO220-RA-600.STEP": height 4.45, standoff -1.79, extent -5.08,-0.19 5.08,17.78

## TO220-RA-650 [mm]
pads (4):
  oval 2x3 hole 1.2: 1(-2.54,0) 2(0,0)
  oct 2x3 hole 1.2: 3(2.54,0)
  round 6.5 hole 4: 4(0,17.78)
Top Overlay:
  circle w0.125: c0,17.78 r3.25
  lines w0.125: -5.08,14.139 5.08,14.139 ; -3.81,4.614 -3.81,5.249 ; -3.762,4.582 -3.647,4.421 ; -2.117,4.421 -2.117,5.249 ; -0.847,5.249 -0.847,4.826 -0.635,4.421 ; 0.635,4.421 0.847,4.826 0.847,5.249 ; 2.117,4.421 2.117,5.249 ; 3.655,4.421 3.818,4.638 ; 3.81,4.614 3.81,5.249 ; -5.08,5.249 -5.08,20.489 5.08,20.489 5.08,5.249 -5.08,5.249
Top Assembly:
  circle w0.2: c0,17.78 r3.25
  lines w0.2: -5.08,14.139 5.08,14.139 ; -5.08,5.249 -5.08,20.489 5.08,20.489 5.08,5.249 -5.08,5.249
3D body "TO220-RA-650.STEP": height 4.45, standoff -1.79, extent -5.08,-0.19 5.08,20.36